# Altium schematic symbol library altera.SCHLIB: 68 symbols (part 4 of 6)
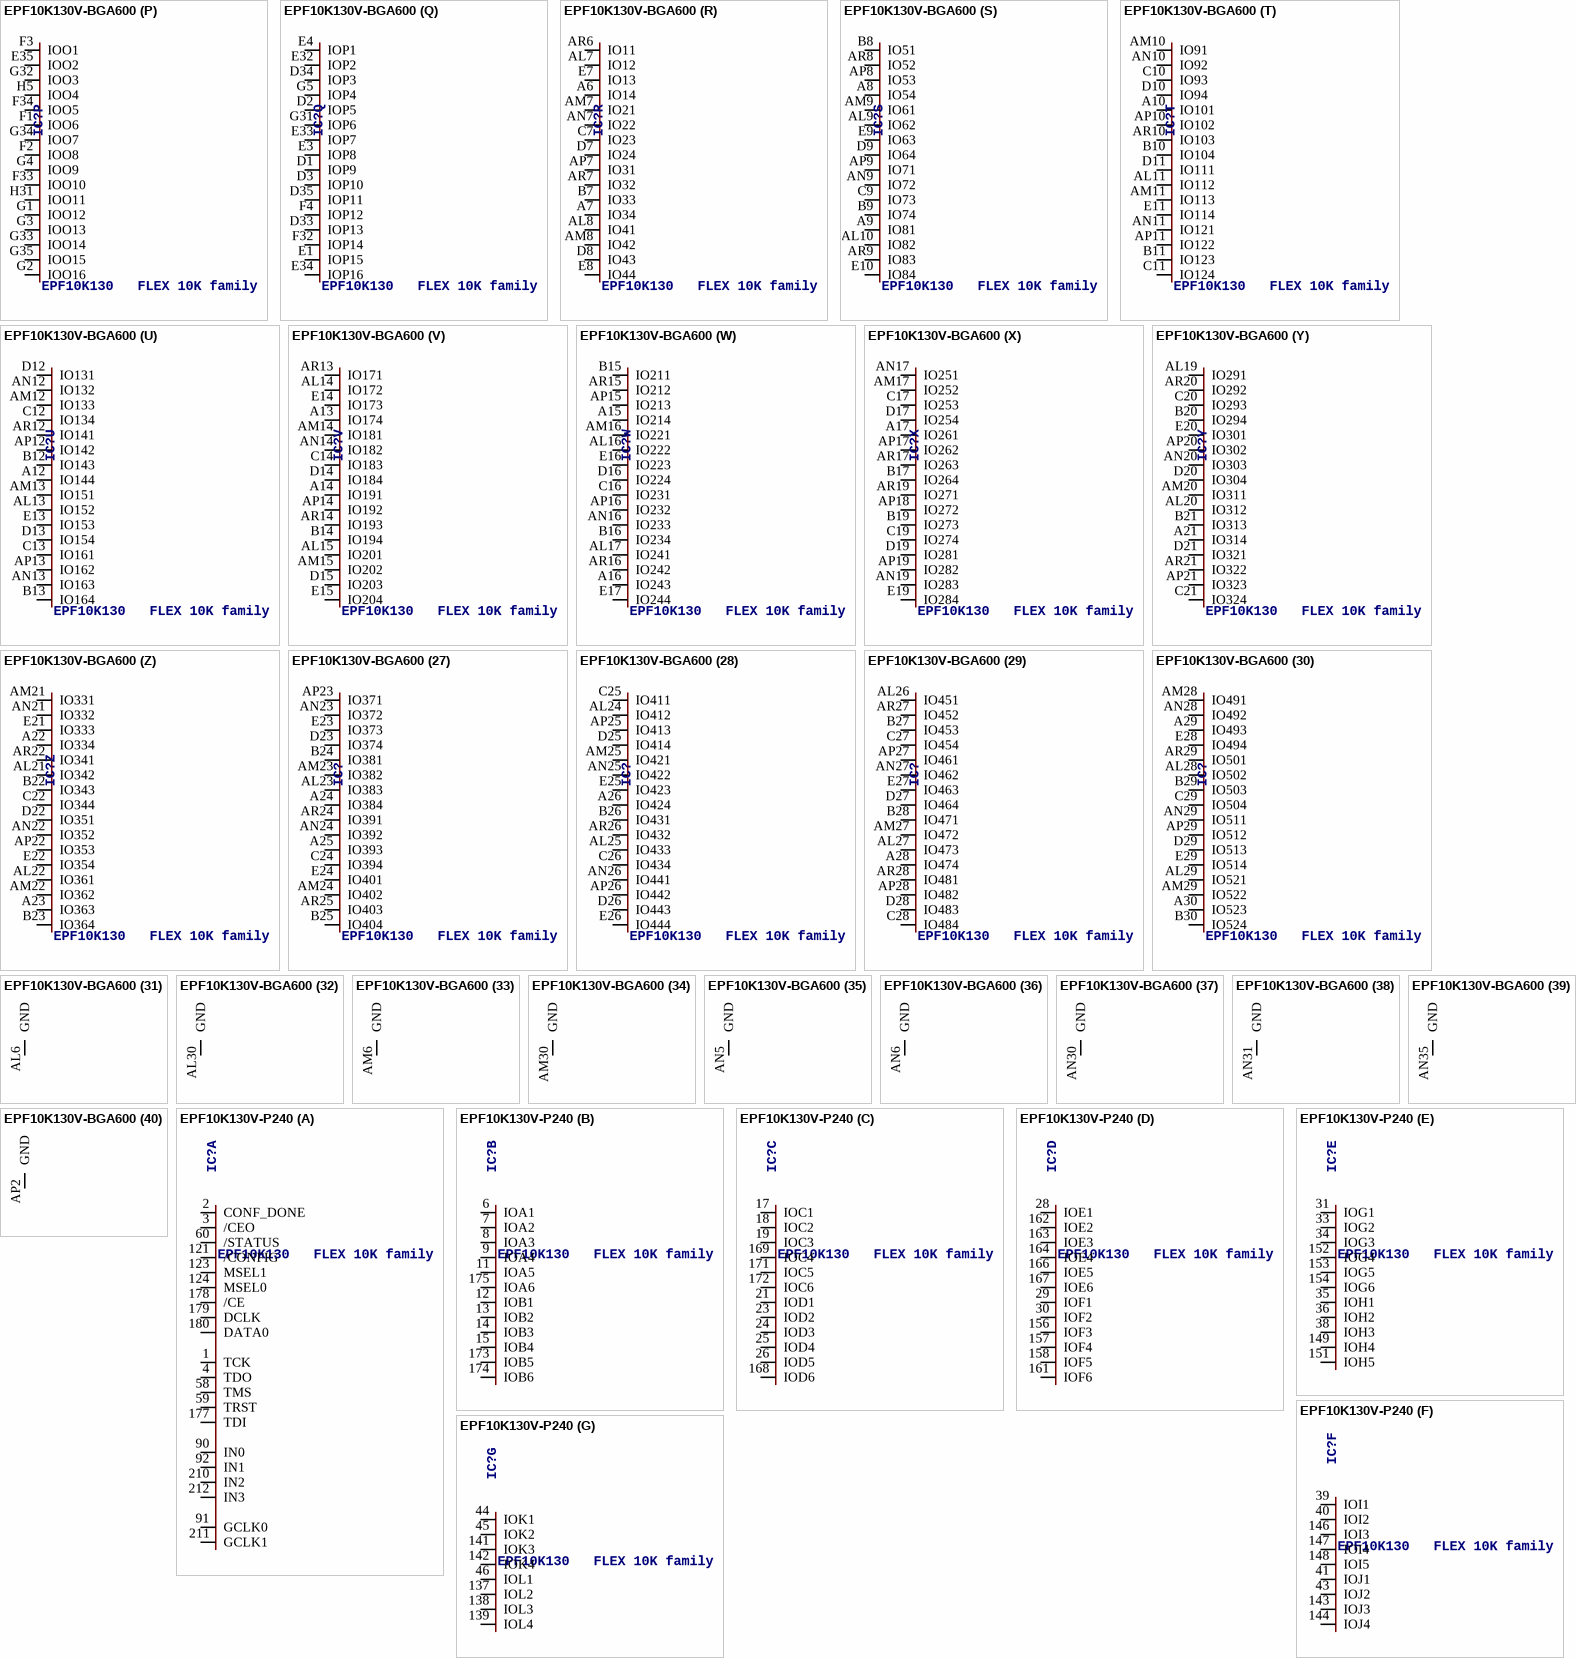
[diagram p60: symbols EPF10K130V-BGA600 to EPF10K130V-P240]

## EPF10K130V-BGA600
designator IC?, comment EPF10K130   FLEX 10K family
OC_FARNELL: unknown; OC_NEWARK: unknown
footprint BGA600
part A pins: AL18 GCLK1, AL31 TCK, AM4 DATA0, AM18 IN1, AM32 CONF_DONE, AN1 TDI, AN2 /CE, AN18 IN0, AN34 TDO, AP1 DCLK, AP35 /CEO, C1 MSEL1, C18 IN2, C34 TRST, C35 TMS, D4 /CONFIG, D18 IN3, D32 /STATUS, E18 GCLK0, F5 MSEL0
part B pins: AJ5 IOA11, AJ31 IOA8, AK4 IOA9, AK5 IOA2, AK32 IOA10, AL2 IOA1, AL4 IOA13, AL32 IOA3, AL33 IOA4, AL34 IOA14, AM1 IOA5, AM2 IOA15, AM3 IOA6, AM33 IOA16, AM34 IOA7, AM35 IOA12
part C pins: AH5 IOB13, AH31 IOB12, AJ2 IOB1, AJ3 IOB3, AJ4 IOB6, AJ32 IOB9, AJ33 IOB2, AJ34 IOB4, AJ35 IOB15, AK1 IOB11, AK2 IOB5, AK3 IOB16, AK33 IOB14, AK34 IOB10, AL1 IOB7, AL35 IOB8
part D pins: AG2 IOC1, AG3 IOC3, AG4 IOC11, AG31 IOC14, AG32 IOC2, AG33 IOC4, AG34 IOC15, AH1 IOC5, AH2 IOC13, AH3 IOC6, AH4 IOC16, AH32 IOC10, AH33 IOC7, AH34 IOC12, AH35 IOC8, AJ1 IOC9
part E pins: AE3 IOD10, AE5 IOD1, AE31 IOD11, AE32 IOD2, AE33 IOD9, AF1 IOD12, AF2 IOD3, AF3 IOD14, AF4 IOD5, AF5 IOD6, AF31 IOD7, AF33 IOD8, AF34 IOD13, AF35 IOD4, AG1 IOD16, AG35 IOD15
part F pins: AC5 IOE1, AC31 IOE6, AC32 IOE11, AD1 IOE3, AD2 IOE12, AD3 IOE4, AD4 IOE14, AD5 IOE7, AD31 IOE10, AD32 IOE13, AD33 IOE5, AD34 IOE2, AE1 IOE16, AE2 IOE8, AE34 IOE9, AE35 IOE15
part G pins: AB1 IOF9, AB2 IOF1, AB3 IOF12, AB4 IOF3, AB31 IOF13, AB32 IOF4, AB33 IOF10, AB34 IOF2, AB35 IOF11, AC1 IOF14, AC2 IOF5, AC3 IOF15, AC4 IOF6, AC33 IOF7, AC34 IOF16, AC35 IOF8
part H pins: AA1 IOG7, AA2 IOG14, AA3 IOG3, AA4 IOG16, AA5 IOG8, AA31 IOG9, AA32 IOG15, AA34 IOG4, AA35 IOG13, Y3 IOG6, Y4 IOG1, Y5 IOG12, Y31 IOG10, Y32 IOG11, Y33 IOG2, Y34 IOG5
part I pins: V4 IOH2, V5 IOH4, V31 IOH7, V33 IOH1, W1 IOH3, W2 IOH5, W3 IOH10, W4 IOH11, W5 IOH16, W31 IOH15, W32 IOH14, W33 IOH8, W34 IOH6, W35 IOH9, Y1 IOH12, Y35 IOH13
part J pins: T5 IOI2, T31 IOI1, U1 IOI3, U2 IOI6, U4 IOI9, U5 IOI7, U31 IOI11, U32 IOI13, U33 IOI10, U34 IOI5, U35 IOI4, V1 IOI8, V2 IOI14, V3 IOI15, V34 IOI16, V35 IOI12
part K pins: R2 IOJ9, R3 IOJ14, R4 IOJ11, R5 IOJ2, R31 IOJ12, R32 IOJ3, R33 IOJ10, R34 IOJ15, R35 IOJ8, T1 IOJ13, T2 IOJ4, T3 IOJ1, T4 IOJ5, T32 IOJ6, T33 IOJ16, T34 IOJ7
part L pins: N3 IOK8, N4 IOK7, N5 IOK2, N31 IOK9, N32 IOK10, N33 IOK1, P1 IOK11, P2 IOK5, P3 IOK13, P4 IOK4, P31 IOK15, P32 IOK6, P33 IOK16, P34 IOK3, P35 IOK12, R1 IOK14
part M pins: L1 IOL9, L2 IOL2, L34 IOL1, L35 IOL10, M1 IOL11, M3 IOL4, M4 IOL12, M5 IOL7, M31 IOL14, M32 IOL5, M33 IOL13, M34 IOL3, M35 IOL8, N1 IOL6, N2 IOL15, N35 IOL16
part N pins: J1 IOM8, J35 IOM10, K1 IOM4, K2 IOM11, K3 IOM2, K4 IOM7, K31 IOM1, K33 IOM9, K34 IOM12, K35 IOM3, L3 IOM13, L4 IOM14, L5 IOM6, L31 IOM5, L32 IOM15, L33 IOM16
part O pins: H2 ION8, H3 ION3, H4 ION1, H32 ION10, H33 ION2, H34 ION12, H35 ION4, J2 ION5, J3 ION13, J4 ION6, J5 ION9, J31 ION11, J32 ION14, J33 ION7, J34 ION16, K5 ION15
part P pins: E35 IOO2, F1 IOO6, F2 IOO8, F3 IOO1, F33 IOO10, F34 IOO5, G1 IOO12, G2 IOO16, G3 IOO13, G4 IOO9, G32 IOO3, G33 IOO14, G34 IOO7, G35 IOO15, H5 IOO4, H31 IOO11
part Q pins: D1 IOP9, D2 IOP5, D3 IOP10, D33 IOP13, D34 IOP3, D35 IOP11, E1 IOP15, E3 IOP8, E4 IOP1, E32 IOP2, E33 IOP7, E34 IOP16, F4 IOP12, F32 IOP14, G5 IOP4, G31 IOP6
part R pins: A6 IO14, A7 IO34, AL7 IO12, AL8 IO41, AM7 IO21, AM8 IO42, AN7 IO22, AP7 IO31, AR6 IO11, AR7 IO32, B7 IO33, C7 IO23, D7 IO24, D8 IO43, E7 IO13, E8 IO44
part S pins: A8 IO54, A9 IO81, AL9 IO62, AL10 IO82, AM9 IO61, AN9 IO72, AP8 IO53, AP9 IO71, AR8 IO52, AR9 IO83, B8 IO51, B9 IO74, C9 IO73, D9 IO64, E9 IO63, E10 IO84
part T pins: A10 IO101, AL11 IO112, AM10 IO91, AM11 IO113, AN10 IO92, AN11 IO121, AP10 IO102, AP11 IO122, AR10 IO103, B10 IO104, B11 IO123, C10 IO93, C11 IO124, D10 IO94, D11 IO111, E11 IO114
part U pins: A12 IO144, AL13 IO152, AM12 IO133, AM13 IO151, AN12 IO132, AN13 IO163, AP12 IO142, AP13 IO162, AR12 IO141, B12 IO143, B13 IO164, C12 IO134, C13 IO161, D12 IO131, D13 IO154, E13 IO153
part V pins: A13 IO174, A14 IO191, AL14 IO172, AL15 IO201, AM14 IO181, AM15 IO202, AN14 IO182, AP14 IO192, AR13 IO171, AR14 IO193, B14 IO194, C14 IO183, D14 IO184, D15 IO203, E14 IO173, E15 IO204
part W pins: A15 IO214, A16 IO243, AL16 IO222, AL17 IO241, AM16 IO221, AN16 IO233, AP15 IO213, AP16 IO232, AR15 IO212, AR16 IO242, B15 IO211, B16 IO234, C16 IO231, D16 IO224, E16 IO223, E17 IO244
part X pins: A17 IO261, AM17 IO252, AN17 IO251, AN19 IO283, AP17 IO262, AP18 IO272, AP19 IO282, AR17 IO263, AR19 IO271, B17 IO264, B19 IO273, C17 IO253, C19 IO274, D17 IO254, D19 IO281, E19 IO284
part Y pins: A21 IO314, AL19 IO291, AL20 IO312, AM20 IO311, AN20 IO303, AP20 IO302, AP21 IO323, AR20 IO292, AR21 IO322, B20 IO294, B21 IO313, C20 IO293, C21 IO324, D20 IO304, D21 IO321, E20 IO301
part Z pins: A22 IO334, A23 IO363, AL21 IO342, AL22 IO361, AM21 IO331, AM22 IO362, AN21 IO332, AN22 IO352, AP22 IO353, AR22 IO341, B22 IO343, B23 IO364, C22 IO344, D22 IO351, E21 IO333, E22 IO354
part 27 pins: A24 IO384, A25 IO393, AL23 IO383, AM23 IO382, AM24 IO402, AN23 IO372, AN24 IO392, AP23 IO371, AR24 IO391, AR25 IO403, B24 IO381, B25 IO404, C24 IO394, D23 IO374, E23 IO373, E24 IO401
part 28 pins: A26 IO424, AL24 IO412, AL25 IO433, AM25 IO421, AN25 IO422, AN26 IO441, AP25 IO413, AP26 IO442, AR26 IO432, B26 IO431, C25 IO411, C26 IO434, D25 IO414, D26 IO443, E25 IO423, E26 IO444
part 29 pins: A28 IO474, AL26 IO451, AL27 IO473, AM27 IO472, AN27 IO462, AP27 IO461, AP28 IO482, AR27 IO452, AR28 IO481, B27 IO453, B28 IO471, C27 IO454, C28 IO484, D27 IO464, D28 IO483, E27 IO463
part 30 pins: A29 IO493, A30 IO523, AL28 IO502, AL29 IO521, AM28 IO491, AM29 IO522, AN28 IO492, AN29 IO511, AP29 IO512, AR29 IO501, B29 IO503, B30 IO524, C29 IO504, D29 IO513, E28 IO494, E29 IO514
part 31 pins: AL6 GND (power)
part 32 pins: AL30 GND (power)
part 33 pins: AM6 GND (power)
part 34 pins: AM30 GND (power)
part 35 pins: AN5 GND (power)
part 36 pins: AN6 GND (power)
part 37 pins: AN30 GND (power)
part 38 pins: AN31 GND (power)
part 39 pins: AN35 GND (power)
part 40 pins: AP2 GND (power)
part 41 pins: AP3 GND (power)
part 42 pins: AP4 GND (power)
part 43 pins: AP5 GND (power)
part 44 pins: AP6 GND (power)
part 45 pins: AP30 GND (power)
part 46 pins: AP31 GND (power)
part 47 pins: AP32 GND (power)
part 48 pins: AP33 GND (power)
part 49 pins: AR1 GND (power)
part 50 pins: AR2 GND (power)
part 51 pins: AR3 GND (power)
part 52 pins: AR4 GND (power)
part 53 pins: AR5 GND (power)
part 54 pins: AR30 GND (power)
part 55 pins: AR31 GND (power)
part 56 pins: AR32 GND (power)
part 57 pins: AR33 GND (power)
part 58 pins: AR34 GND (power)
part 59 pins: AR35 GND (power)
part 60 pins: A1 GND (power)
part 61 pins: A2 GND (power)
part 62 pins: A3 GND (power)
part 63 pins: A4 GND (power)
part 64 pins: A5 GND (power)
part 65 pins: A18 GND (power)
part 66 pins: A31 GND (power)
part 67 pins: A32 GND (power)
part 68 pins: A33 GND (power)
part 69 pins: A34 GND (power)
part 70 pins: A35 GND (power)
part 71 pins: B2 GND (power)
part 72 pins: B3 GND (power)
part 73 pins: B4 GND (power)
part 74 pins: B5 GND (power)
part 75 pins: B6 GND (power)
part 76 pins: B31 GND (power)
part 77 pins: B32 GND (power)
part 78 pins: B33 GND (power)
part 79 pins: B34 GND (power)
part 80 pins: B35 GND (power)
part 81 pins: C5 GND (power)
part 82 pins: C6 GND (power)
part 83 pins: C30 GND (power)
part 84 pins: C31 GND (power)
part 85 pins: D6 GND (power)
part 86 pins: D30 GND (power)
part 87 pins: E6 GND (power)
part 88 pins: E30 GND (power)
part 89 pins: AA33 VCC (power)
part 90 pins: AB5 VCC (power)
part 91 pins: AD35 VCC (power)
part 92 pins: AE4 VCC (power)
part 93 pins: AF32 VCC (power)
part 94 pins: AG5 VCC (power)
part 95 pins: AK31 VCC (power)
part 96 pins: AK35 VCC (power)
part 97 pins: AL3 VCC (power)
part 98 pins: AP24 VCC (power)
part 99 pins: AR11 VCC (power)
part 100 pins: AR18 VCC (power)
part 101 pins: A11 VCC (power)
part 102 pins: A19 VCC (power)
part 103 pins: B1 VCC (power)
part 104 pins: B18 VCC (power)
part 105 pins: D24 VCC (power)
part 106 pins: E2 VCC (power)
part 107 pins: F31 VCC (power)
part 108 pins: F35 VCC (power)
part 109 pins: H1 VCC (power)
part 110 pins: K32 VCC (power)
part 111 pins: M2 VCC (power)
part 112 pins: N34 VCC (power)
part 113 pins: P5 VCC (power)
part 114 pins: T35 VCC (power)
part 115 pins: U3 VCC (power)
part 116 pins: V32 VCC (power)
part 117 pins: Y2 VCC (power)
part 118 pins: AL5 VCCIO (power)
part 119 pins: AL12 VCCIO (power)
part 120 pins: AM5 VCCIO (power)
part 121 pins: AM19 VCCIO (power)
part 122 pins: AM26 VCCIO (power)
part 123 pins: AM31 VCCIO (power)
part 124 pins: AN3 VCCIO (power)
part 125 pins: AN4 VCCIO (power)
part 126 pins: AN8 VCCIO (power)
part 127 pins: AN15 VCCIO (power)
part 128 pins: AN32 VCCIO (power)
part 129 pins: AN33 VCCIO (power)
part 130 pins: AP34 VCCIO (power)
part 131 pins: AR23 VCCIO (power)
part 132 pins: A20 VCCIO (power)
part 133 pins: A27 VCCIO (power)
part 134 pins: C2 VCCIO (power)
part 135 pins: C3 VCCIO (power)
part 136 pins: C4 VCCIO (power)
part 137 pins: C8 VCCIO (power)
part 138 pins: C15 VCCIO (power)
part 139 pins: C23 VCCIO (power)
part 140 pins: C32 VCCIO (power)
part 141 pins: C33 VCCIO (power)
part 142 pins: D5 VCCIO (power)
part 143 pins: D31 VCCIO (power)
part 144 pins: E5 VCCIO (power)
part 145 pins: E12 VCCIO (power)
part 146 pins: E31 VCCIO (power)

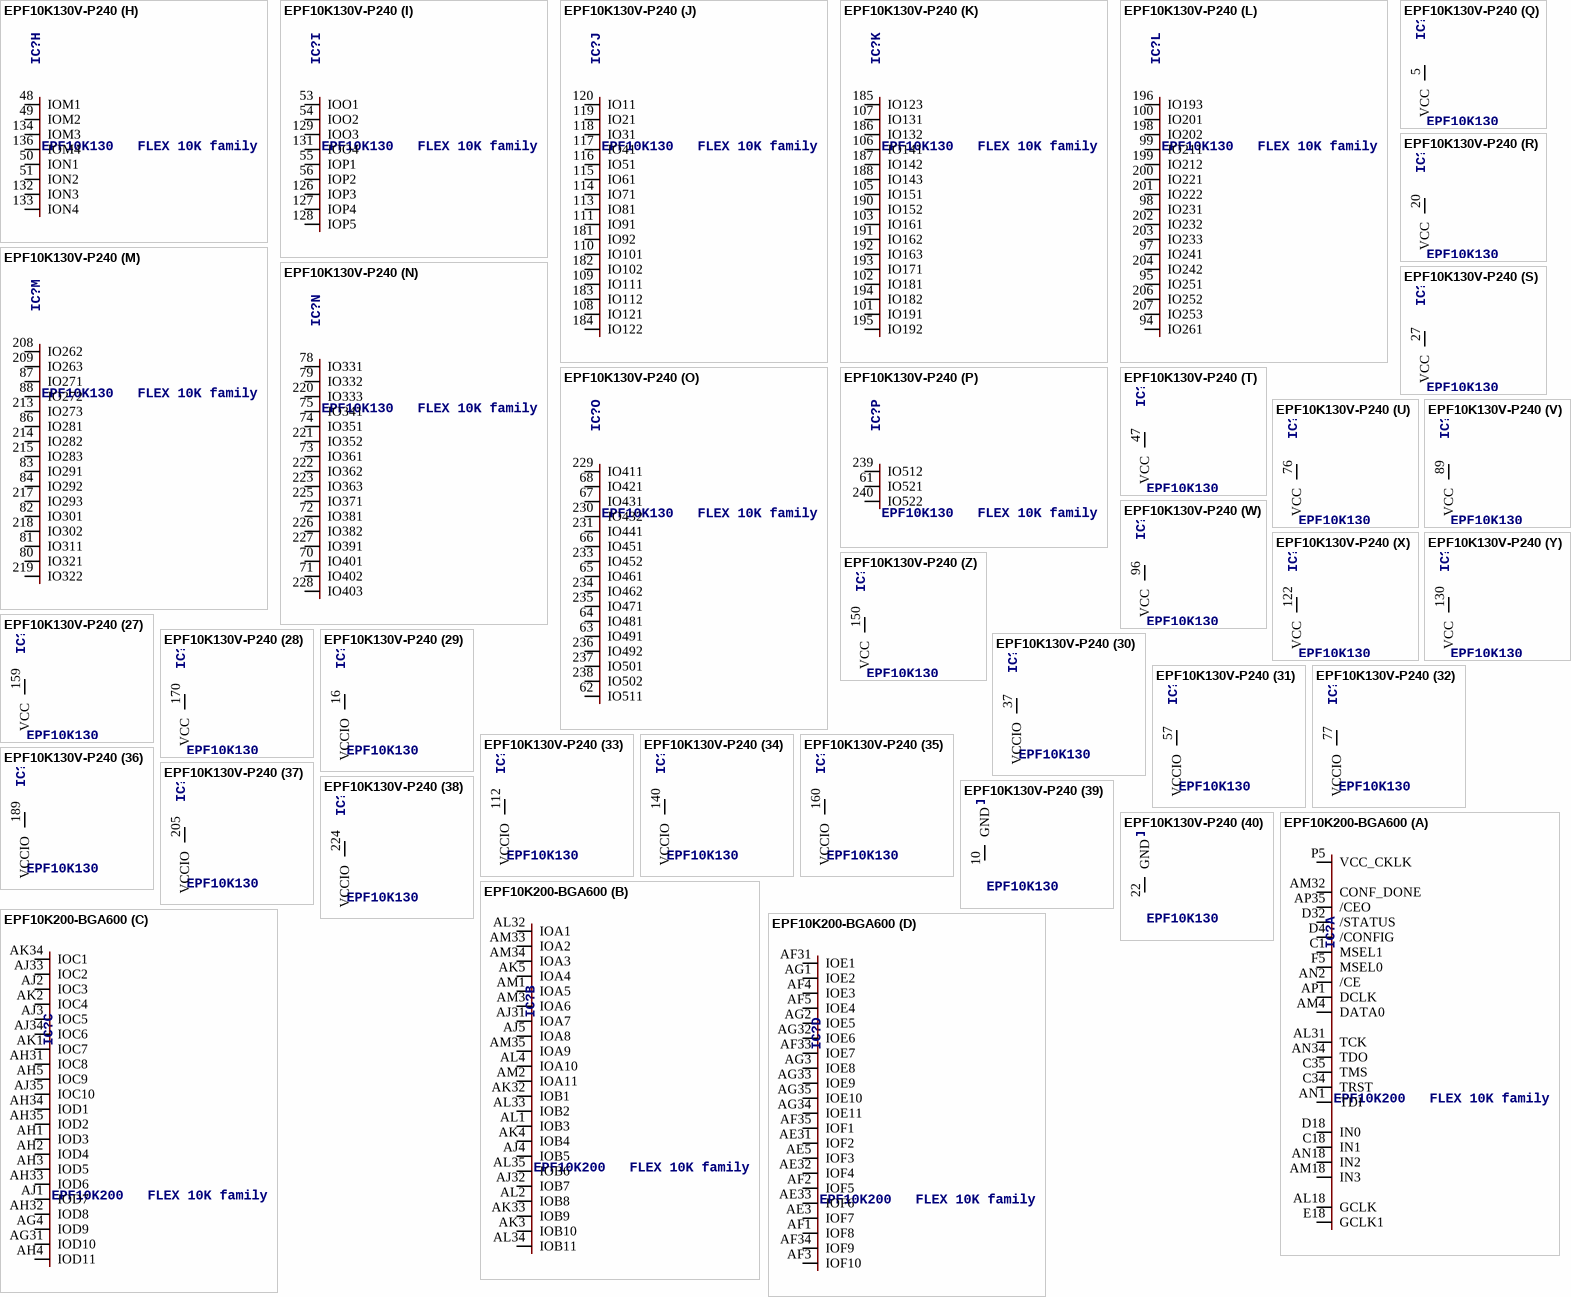
[diagram p28: symbols EPF10K130V-P240 to EPF10K200-BGA600]

## EPF10K130V-P240
designator IC?, comment EPF10K130   FLEX 10K family
OC_FARNELL: unknown; OC_NEWARK: unknown
footprint PQFP240
part A pins: 1 TCK, 2 CONF_DONE, 3 /CEO, 4 TDO, 58 TMS, 59 TRST, 60 /STATUS, 90 IN0, 91 GCLK0, 92 IN1, 121 /CONFIG, 123 MSEL1, 124 MSEL0, 177 TDI, 178 /CE, 179 DCLK, 180 DATA0, 210 IN2, 211 GCLK1, 212 IN3
part B pins: 6 IOA1, 7 IOA2, 8 IOA3, 9 IOA4, 11 IOA5, 12 IOB1, 13 IOB2, 14 IOB3, 15 IOB4, 173 IOB5, 174 IOB6, 175 IOA6
part C pins: 17 IOC1, 18 IOC2, 19 IOC3, 21 IOD1, 23 IOD2, 24 IOD3, 25 IOD4, 26 IOD5, 168 IOD6, 169 IOC4, 171 IOC5, 172 IOC6
part D pins: 28 IOE1, 29 IOF1, 30 IOF2, 156 IOF3, 157 IOF4, 158 IOF5, 161 IOF6, 162 IOE2, 163 IOE3, 164 IOE4, 166 IOE5, 167 IOE6
part E pins: 31 IOG1, 33 IOG2, 34 IOG3, 35 IOH1, 36 IOH2, 38 IOH3, 149 IOH4, 151 IOH5, 152 IOG4, 153 IOG5, 154 IOG6
part F pins: 39 IOI1, 40 IOI2, 41 IOJ1, 43 IOJ2, 143 IOJ3, 144 IOJ4, 146 IOI3, 147 IOI4, 148 IOI5
part G pins: 44 IOK1, 45 IOK2, 46 IOL1, 137 IOL2, 138 IOL3, 139 IOL4, 141 IOK3, 142 IOK4
part H pins: 48 IOM1, 49 IOM2, 50 ION1, 51 ION2, 132 ION3, 133 ION4, 134 IOM3, 136 IOM4
part I pins: 53 IOO1, 54 IOO2, 55 IOP1, 56 IOP2, 126 IOP3, 127 IOP4, 128 IOP5, 129 IOO3, 131 IOO4
part J pins: 108 IO121, 109 IO111, 110 IO101, 111 IO91, 113 IO81, 114 IO71, 115 IO61, 116 IO51, 117 IO41, 118 IO31, 119 IO21, 120 IO11, 181 IO92, 182 IO102, 183 IO112, 184 IO122
part K pins: 101 IO191, 102 IO181, 103 IO161, 105 IO151, 106 IO141, 107 IO131, 185 IO123, 186 IO132, 187 IO142, 188 IO143, 190 IO152, 191 IO162, 192 IO163, 193 IO171, 194 IO182, 195 IO192
part L pins: 94 IO261, 95 IO251, 97 IO241, 98 IO231, 99 IO211, 100 IO201, 196 IO193, 198 IO202, 199 IO212, 200 IO221, 201 IO222, 202 IO232, 203 IO233, 204 IO242, 206 IO252, 207 IO253
part M pins: 80 IO321, 81 IO311, 82 IO301, 83 IO291, 84 IO292, 86 IO281, 87 IO271, 88 IO272, 208 IO262, 209 IO263, 213 IO273, 214 IO282, 215 IO283, 217 IO293, 218 IO302, 219 IO322
part N pins: 70 IO401, 71 IO402, 72 IO381, 73 IO361, 74 IO351, 75 IO341, 78 IO331, 79 IO332, 220 IO333, 221 IO352, 222 IO362, 223 IO363, 225 IO371, 226 IO382, 227 IO391, 228 IO403
part O pins: 62 IO511, 63 IO491, 64 IO481, 65 IO461, 66 IO451, 67 IO431, 68 IO421, 229 IO411, 230 IO432, 231 IO441, 233 IO452, 234 IO462, 235 IO471, 236 IO492, 237 IO501, 238 IO502
part P pins: 61 IO521, 239 IO512, 240 IO522
part Q pins: 5 VCC (power)
part R pins: 20 VCC (power)
part S pins: 27 VCC (power)
part T pins: 47 VCC (power)
part U pins: 76 VCC (power)
part V pins: 89 VCC (power)
part W pins: 96 VCC (power)
part X pins: 122 VCC (power)
part Y pins: 130 VCC (power)
part Z pins: 150 VCC (power)
part 27 pins: 159 VCC (power)
part 28 pins: 170 VCC (power)
part 29 pins: 16 VCCIO (power)
part 30 pins: 37 VCCIO (power)
part 31 pins: 57 VCCIO (power)
part 32 pins: 77 VCCIO (power)
part 33 pins: 112 VCCIO (power)
part 34 pins: 140 VCCIO (power)
part 35 pins: 160 VCCIO (power)
part 36 pins: 189 VCCIO (power)
part 37 pins: 205 VCCIO (power)
part 38 pins: 224 VCCIO (power)
part 39 pins: 10 GND (power)
part 40 pins: 22 GND (power)
part 41 pins: 32 GND (power)
part 42 pins: 42 GND (power)
part 43 pins: 52 GND (power)
part 44 pins: 69 GND (power)
part 45 pins: 85 GND (power)
part 46 pins: 93 GND (power)
part 47 pins: 104 GND (power)
part 48 pins: 125 GND (power)
part 49 pins: 135 GND (power)
part 50 pins: 145 GND (power)
part 51 pins: 155 GND (power)
part 52 pins: 165 GND (power)
part 53 pins: 176 GND (power)
part 54 pins: 197 GND (power)
part 55 pins: 216 GND (power)
part 56 pins: 232 GND (power)

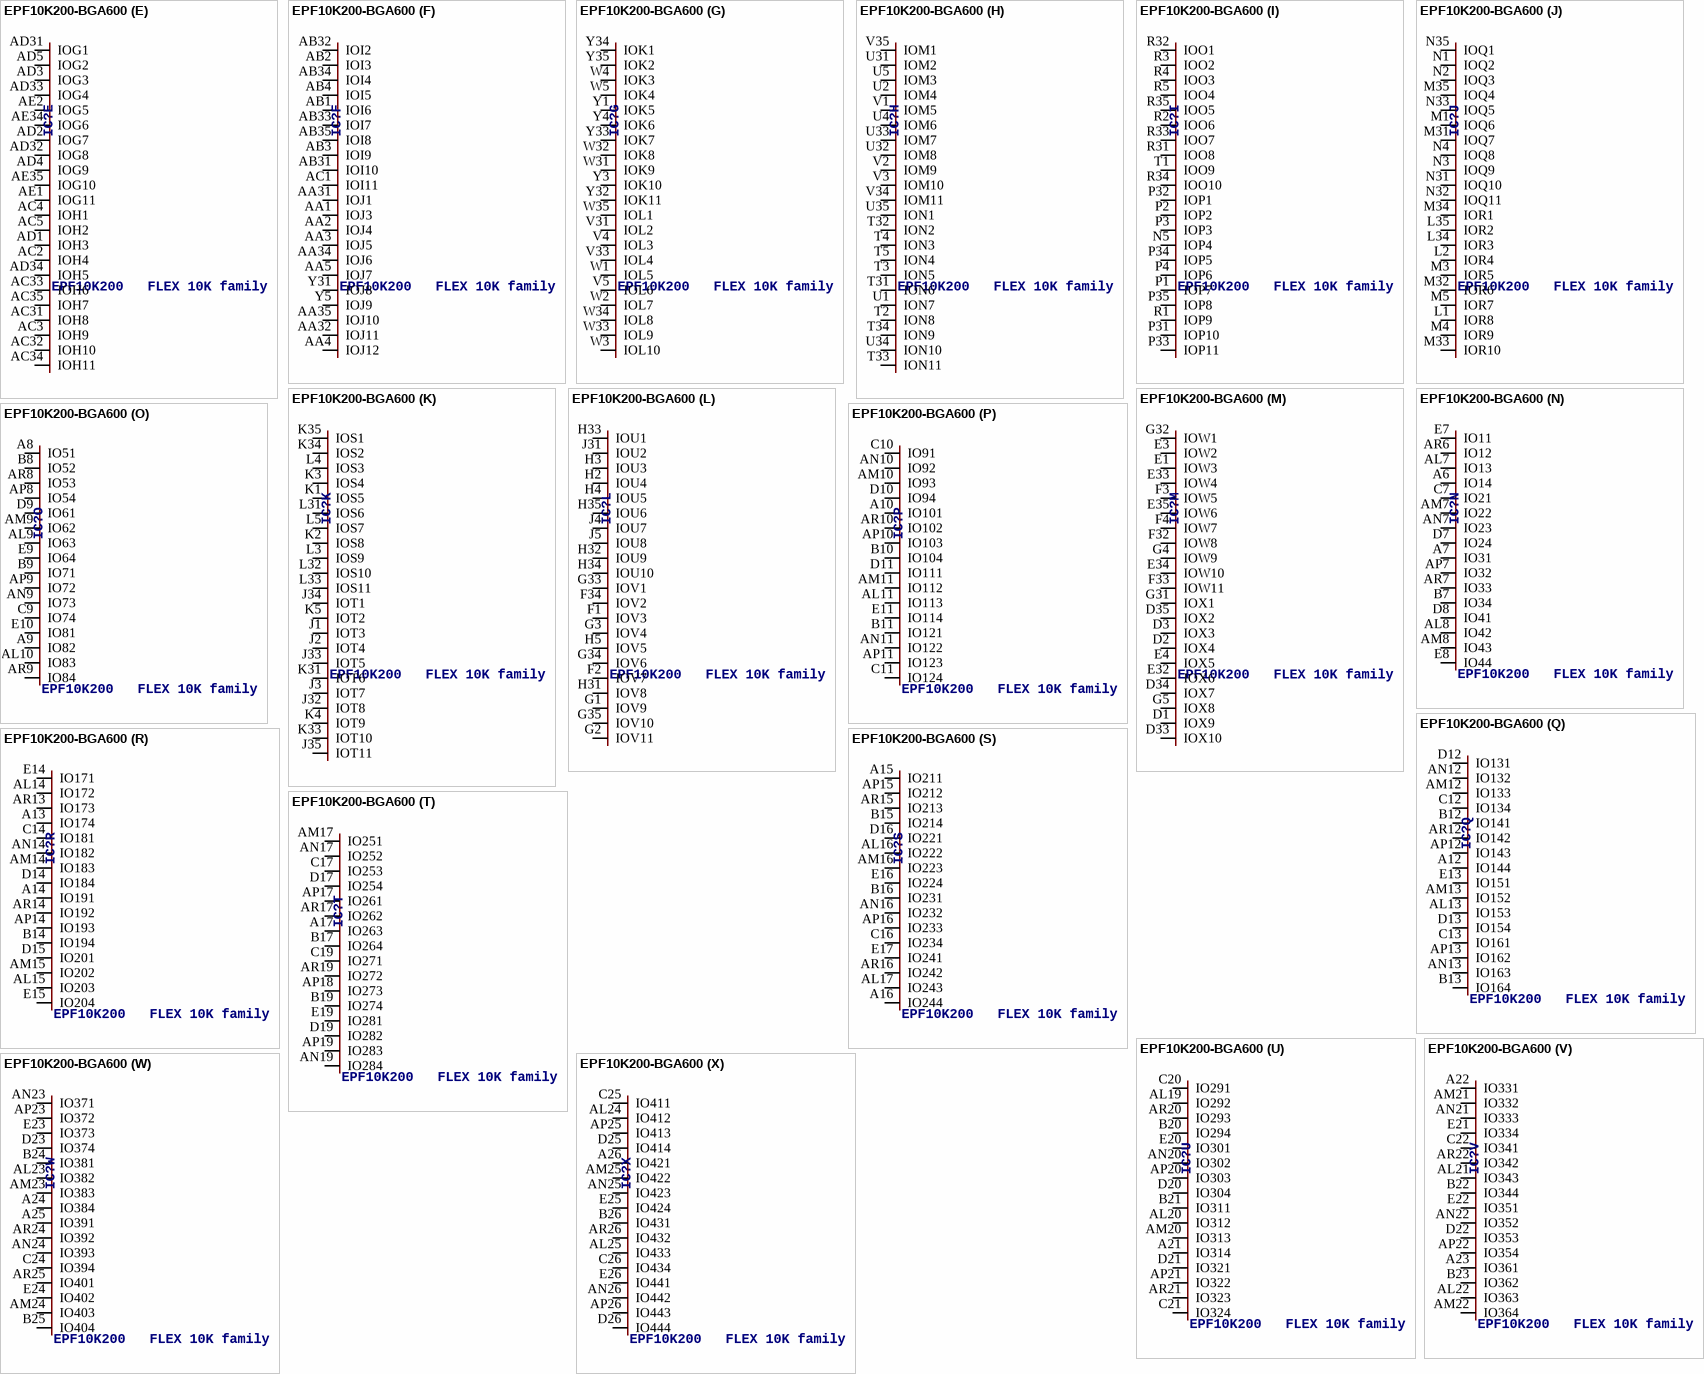
[diagram p29: symbol EPF10K200-BGA600]
